# Altium footprint library Mylib.PcbLib: 320 footprints (part 8 of 20)
Each footprint in its own frame and in the unit in brackets; x right, y up, seen from the top. Pads: shape width x height; smd on the part's side, far side on the other; paste and mask are expansions set on the pad; w line width, h text height; cw(c..) or ccw(c..) is an arc to the next point about the centre after c.
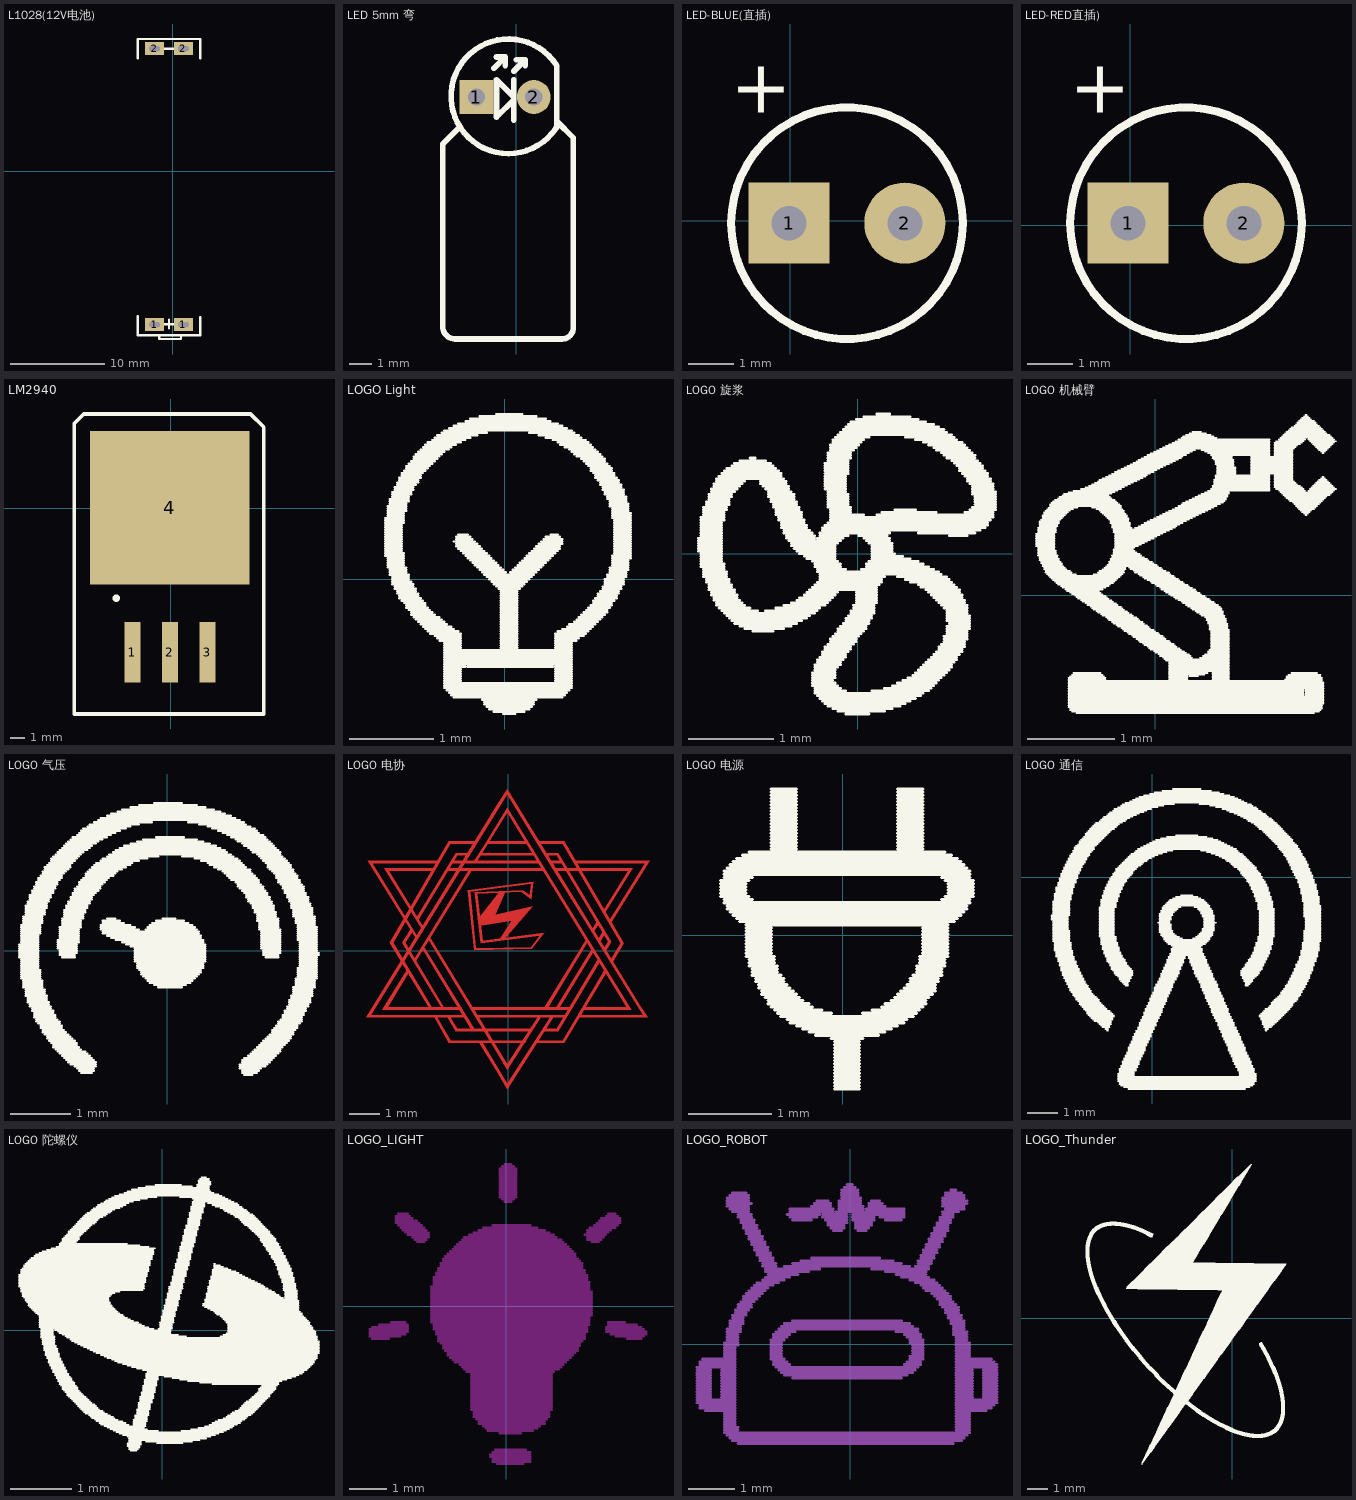
[diagram p7: the footprints below, top view; thin cyan lines are the x and y axes]

## L1028(12V电池) [mil]
pads (4):
  rect 80x55 hole 20 slot 45 at 0 deg: 1(-75,-640) 1(45,-640) 2(-75,510) 2(45,510)
Top Overlay:
  lines w10: -145,-605 -145,-685 115,-685 115,-610 ; -145,470 -145,550 115,550 115,470 ; -55,-690 -55,-700 35,-700 35,-690 ; -40,510 9.06,510 ; -39.37,-637.72 10.63,-637.72 ; -15,-655 -15,-620

## LED 5mm 弯 [mm]
pads (2):
  rect 1.5x1.5 hole 0.762: 1(-1.754,-3.5)
  round 1.5 hole 0.762: 2(0.786,-3.5)
Top Overlay:
  lines w0.254: -2.54,-4.878 -3.254,-5.592 -3.254,-5.794 -3.254,-13.663 ccw(c-2.693,-13.663) -2.693,-14.224 2.032,-14.224 ccw(c2.032,-13.716) 2.54,-13.716 2.54,-5.39 2.54,-5.31 1.802,-4.572 ; -0.992,-2.23 -0.484,-1.722 ; -0.865,-1.722 -0.484,-1.722 ; -0.484,-2.103 -0.484,-1.722 ; -0.103,-4.516 -0.103,-2.738 ; -0.103,-2.357 0.405,-1.849 ; 0.024,-1.849 0.405,-1.849 ; 0.405,-2.103 0.405,-1.849 ; 1.774,-4.878 cw(c-0.339,-3.469) 1.802,-2.103 1.802,-4.85 ; -0.865,-4.389 -0.865,-2.738 -0.103,-3.5 -0.103,-3.627 -0.865,-4.389
3D body "ALSRobot-LED Red 5mm V.step": height 7, standoff -2, extent -3.254,-14.123 2.396,-3.401

## LED-BLUE(直插) [mil]
pads (2):
  rect 70x70 hole 30: 1(-0.98,-1.97)
  round 70 hole 30: 2(99.02,-1.97)
Top Overlay:
  circle w7: c49.02,-1.97 r100
  text "+" at 1.39,78.32 h78.74
3D body: height 204.72, standoff -78.74, extent -21.65,-79.72 116.93,77.76

## LED-RED直插) [mil]
pads (2):
  rect 70x70 hole 30: 1(-1.97,1.97)
  round 70 hole 30: 2(98.03,1.97)
Top Overlay:
  circle w7: c48.03,1.97 r100
  text "+" at 0.41,82.26 h78.74
3D body: height 204.72, standoff -78.74, extent -19.68,-76.76 118.9,80.71

## LM2940 [mm]
pads (4):
  rect 1.1x4.1 smd: 1(-2.591,-9.732) 2(-0.051,-9.732) 3(2.489,-9.732)
  rect 10.8x10.41 smd: 4(-0.051,0.047)
Top Overlay:
  circle w0.25: c-3.691,-6.076 r0.125
  lines w0.254: -6.528,-13.923 -6.528,5.762 -5.893,6.397 5.41,6.397 6.299,5.508 6.299,-13.923 -6.528,-13.923
3D body: height 5, standoff 0, extent -6.2,-5.2 6,6.2

## LOGO Light [mm]
Top Overlay:
  drawing of 294 lines, arcs and shapes, not listed

## LOGO 旋浆 [mm]
Top Overlay:
  drawing of 310 lines, arcs and shapes, not listed

## LOGO 机械臂 [mm]
Top Overlay:
  drawing of 443 lines, arcs and shapes, not listed

## LOGO 气压 [mm]
Top Overlay:
  drawing of 390 lines, arcs and shapes, not listed

## LOGO 电协 [mm]
Top Layer:
  region: 2.969,0.374 3.122,0.628 3.172,0.578 3.172,0.527 3.045,0.324 2.995,0.324
  region: 2.766,0.705 2.918,0.959 2.969,0.908 2.969,0.857 2.842,0.654 2.791,0.654
  region: 1.648,2.711 4.087,2.711 4.112,2.711 3.172,1.213 3.147,1.34 3.96,2.635 1.674,2.635
  region: 2.207,2.965 4.646,2.965 4.671,2.965 3.401,0.933 3.337,0.997 4.519,2.889 2.233,2.889
  region: -0.663,3.6 0.607,3.6 0.632,3.575 0.658,3.549 0.683,3.524 -0.714,3.524
  region: 1.928,2.711 1.572,2.711 1.521,2.66 1.598,2.635 1.623,2.635 1.648,2.635 1.928,2.635
  region: 1.75,2.965 1.394,2.965 1.344,2.914 1.445,2.914 1.471,2.889 1.75,2.889
  region: -1.323,3.219 -1.73,3.219 -3.013,1.098 -2.949,1.035 -1.679,3.143 -1.374,3.143
  region: -0.942,3.219 0.836,3.219 0.81,3.219 0.861,3.194 0.861,3.143 -0.993,3.143
  region: -2.009,2.635 -1.958,2.711 1.115,2.711 1.166,2.635
  region: -1.781,2.965 0.988,2.965 0.988,2.94 1.013,2.889 -1.831,2.889
  region: 0.836,2.279 0.759,1.695 0.429,1.949 0.48,2 0.709,1.822 0.759,2.203 -1.247,1.949 -1.057,0.082 0.759,0.12 1.039,0.501 -0.892,0.247 -1.095,1.924 0.48,2 0.455,1.975 0.429,1.949 -1.019,1.873 -0.841,0.324 1.064,0.578 1.191,0.603 0.785,0.07 -1.12,0.019 -1.323,2
  region: -2.816,0.06 -1.192,-2.61 -1.108,-2.61 -1.117,-2.57 -2.797,0.171
  region: -2.613,0.364 -0.333,-3.385 -0.021,-3.914 1.115,-2.14 1.013,-2.14 -0.021,-3.74 -0.866,-2.343 -2.593,0.476
  region: -0.942,-3.029 -0.333,-4.02 -0.021,-4.549 1.521,-2.14 1.42,-2.14 -0.021,-4.375 -0.866,-2.978 -0.942,-3.004
  region: -1.895,-2.953 -0.828,-2.953 0.594,-2.953 0.569,-3.029 -1.946,-3.029 -2.454,-2.14 -2.352,-2.166
  region: -3.178,0.654 -3.193,0.746 -3.482,0.273 -2.173,-1.909 -2.111,-1.861 -3.381,0.273 -3.119,0.671
  region: 3.198,-0.591 1.801,-2.953 0.963,-2.953 0.912,-3.029 1.852,-3.029 3.249,-0.692
  region: 2.966,-0.266 1.598,-2.572 1.217,-2.572 1.191,-2.648 1.648,-2.648 3.045,-0.311
  region: 2.791,0.095 1.572,-1.886 1.674,-1.912 2.842,0.019
  region: 2.588,0.4 1.191,-1.873 1.217,-1.912 1.318,-1.861 2.639,0.324
  region: -1.298,2.66 -3.089,-0.273 -3.038,-0.349 -1.196,2.66
  region: -2.428,2.711 -4.079,2.711 -2.847,0.73 -2.771,0.755 -3.927,2.635 -2.517,2.635
  region: -2.314,2.965 -4.625,2.965 -3.025,0.4 -2.974,0.451 -4.473,2.889 -2.365,2.889
  region: -1.095,3.6 -1.957,3.6 -3.889,0.273 -2.58,-1.909 -2.517,-1.861 -3.787,0.273 -1.908,3.524 -1.095,3.524
  region: 1.013,3.6 1.852,3.6 3.807,0.247 3.426,-0.388 3.376,-0.286 3.706,0.247 1.801,3.524 1.013,3.524
  region: -1.679,-2.572 -0.612,-2.572 0.81,-2.572 0.785,-2.648 -1.73,-2.648 -2.009,-2.166 -1.908,-2.191
  region: -1.019,-2.115 0.759,-2.115 1.928,-2.115 1.902,-2.191 -1.019,-2.191
  region: -1.171,-1.861 0.607,-1.861 2.029,-1.861 2.004,-1.937 -1.171,-1.937
  region: 1.242,3.219 1.648,3.219 3.401,0.298 3.223,-0.007 3.172,0.095 3.299,0.298 1.598,3.143 1.293,3.143
  region: -1.12,2.965 -0.765,3.499 -0.028,4.718 4.061,-1.937 2.512,-1.937 2.563,-1.861 3.909,-1.861 -0.028,4.565 -1.019,2.965
  region: -0.028,5.327 -0.307,4.896 -4.676,-2.191 -4.473,-2.191 -1.45,-2.192 -1.4,-2.115 -1.568,-1.834 -1.654,-1.861 -3.965,-1.861 -3.279,-0.743 -3.33,-0.642 -4.143,-1.937 -1.603,-1.937 -1.488,-2.115 -4.524,-2.115 -0.028,5.15 1.344,2.914 4.442,-2.115 2.41,-2.115 2.36,-2.191 4.595,-2.191 4.341,-1.785
  region: -0.307,1.911 -0.961,1.079 -0.917,0.832 0.124,0.984 -0.282,0.374 -0.13,0.374 0.81,1.467 -0.422,1.187 -0.092,1.949
  text "集" at -1.552,-0.794 h0.76
  text "大" at 1.115,-0.794 h0.76
  text "电" at -0.739,-1.683 h0.76
  text "协" at 0.201,-1.683 h0.76
Top Solder:
  drawing of 33 lines, arcs and shapes, not listed
  text "协" at 0.201,-1.683 h0.76
  text "电" at -0.739,-1.683 h0.76
  text "大" at 1.115,-0.794 h0.76
  text "集" at -1.552,-0.794 h0.76

## LOGO 电源 [mm]
Top Overlay:
  drawing of 152 lines, arcs and shapes, not listed

## LOGO 通信 [mm]
Top Overlay:
  drawing of 720 lines, arcs and shapes, not listed

## LOGO 陀螺仪 [mm]
Top Overlay:
  drawing of 476 lines, arcs and shapes, not listed

## LOGO_LIGHT [mm]
Keep-Out Layer:
  drawing of 155 lines, arcs and shapes, not listed

## LOGO_ROBOT [mm]
Top Solder:
  drawing of 282 lines, arcs and shapes, not listed

## LOGO_Thunder [mm]
Top Overlay:
  drawing of 2284 lines, arcs and shapes, not listed